# Altium footprint library Altium_Lib.PcbLib: 334 footprints (part 5 of 21)
Each footprint in its own frame and in the unit in brackets; x right, y up, seen from the top. Pads: shape width x height; smd on the part's side, far side on the other; paste and mask are expansions set on the pad; w line width, h text height; cw(c..) or ccw(c..) is an arc to the next point about the centre after c.
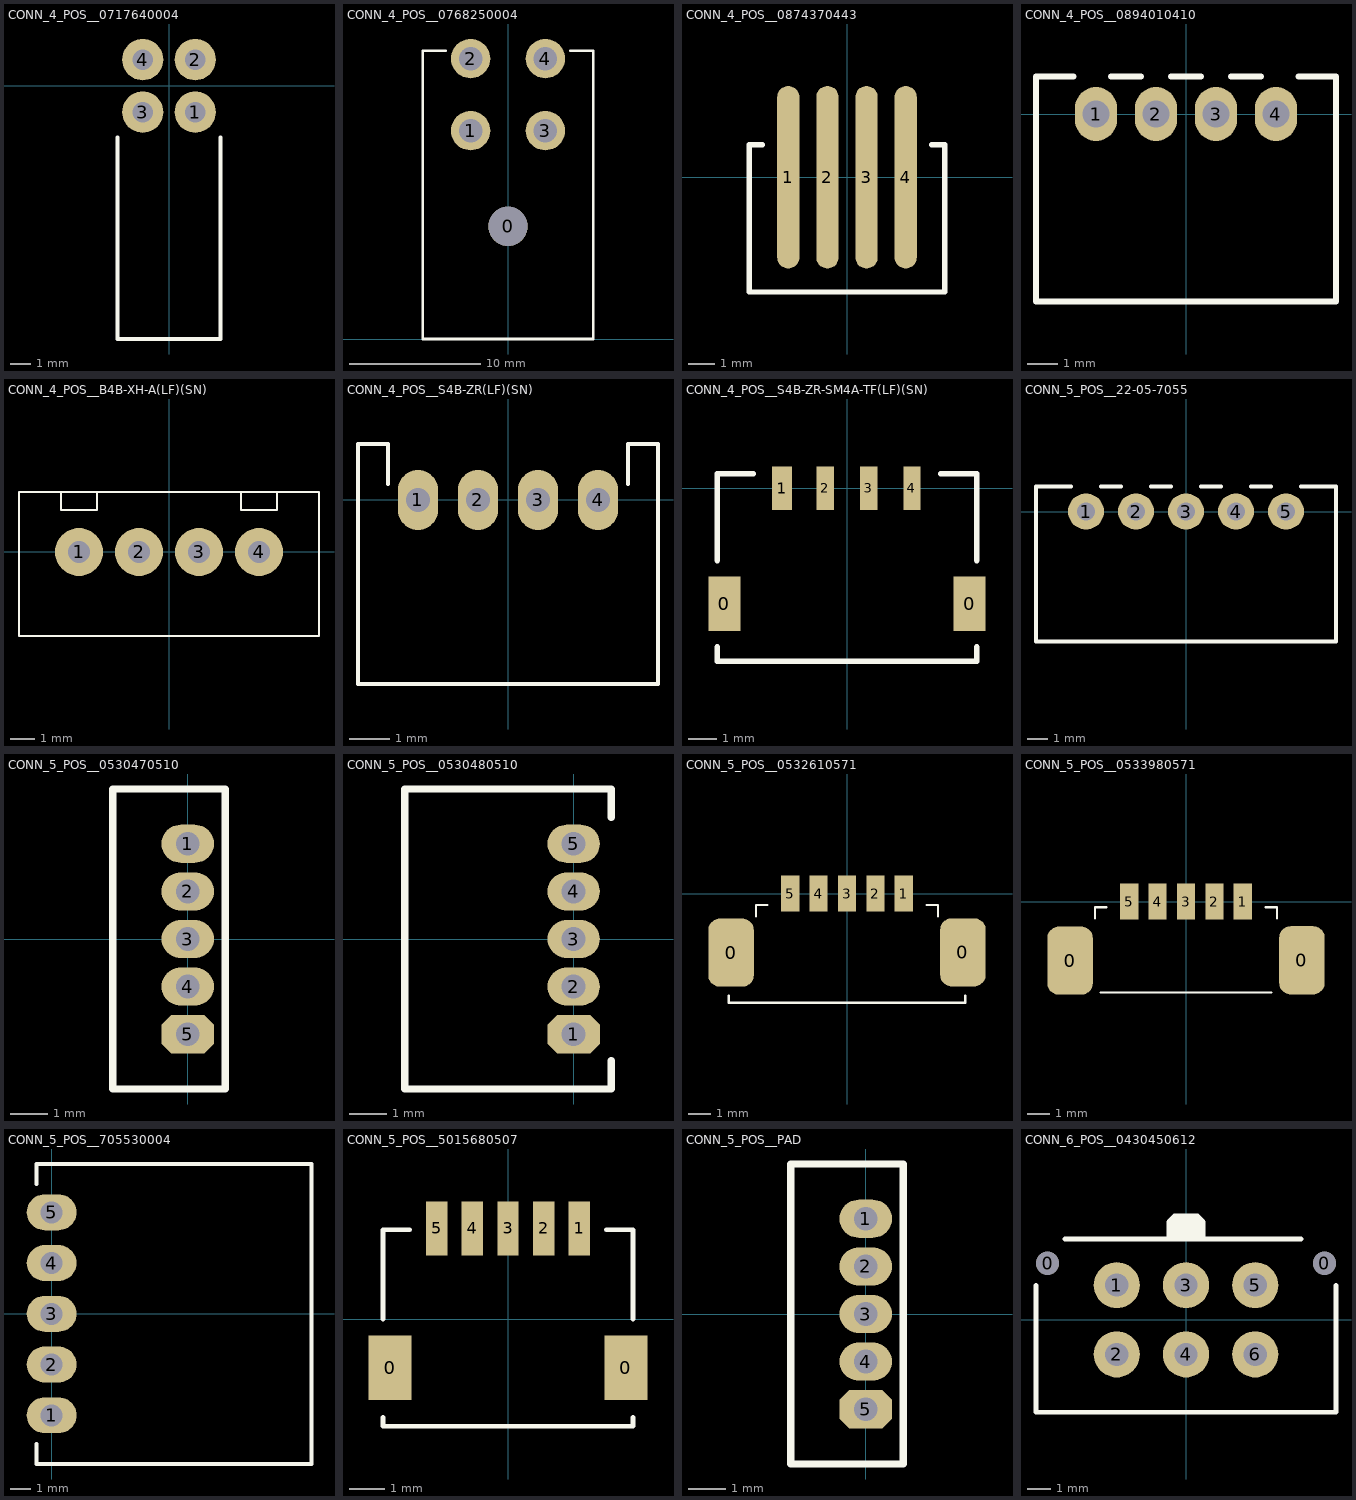
[diagram p4: the footprints below, top view; thin cyan lines are the x and y axes]

## CONN_4_POS__0717640004 [mm]
height 7.37
pads (4):
  round 2 hole 1: 1(1.27,-1.27) 2(1.27,1.27) 3(-1.27,-1.27) 4(-1.27,1.27)
Top Overlay:
  lines w0.2: -2.5,-2.5 -2.5,-12.25 2.5,-12.25 2.5,-2.5
3D body "717640004.stp": height 5.28, standoff -2.59, extent -2.54,-12.294 2.54,1.549

## CONN_4_POS__0768250004 [mm]
pads (5):
  round 3 hole 3 unplated mask+0.05: 0(0,8.6)
  round 3 hole 1.8 mask+0.05: 1(-2.85,15.9) 2(-2.85,21.4) 3(2.85,15.9) 4(2.85,21.4)
Top Overlay:
  lines w0.2: -4.75,22 -6.5,22 -6.5,0 6.5,0 6.5,22 4.75,22
3D body "768250004.stp": height 14.62, standoff -3.52, extent -6.06,0.019 6,21.981

## CONN_4_POS__0874370443 [mm]
pads (4):
  oval 0.85x7 smd mask+0.05: 1(-2.25,0) 2(-0.75,0) 3(0.75,0) 4(2.25,0)
Top Overlay:
  lines w0.2: -3.25,1.25 -3.75,1.25 -3.75,-4.4 3.75,-4.4 3.75,1.25 3.25,1.25
3D body "874380443.stp": height 4.52, standoff 0.01, extent -3.65,-4.375 3.65,3.375

## CONN_4_POS__0894010410 [mm]
height 5.05
pads (4):
  oval 1.4x1.8 hole 0.9: 1(-3,0) 2(-1,0) 3(1,0) 4(3,0)
Top Overlay:
  lines w0.2: -3.75,1.25 -5,1.25 -5,-6.25 5,-6.25 5,1.25 3.75,1.25 ; -2.5,1.25 -1.5,1.25 ; -0.5,1.25 0.5,1.25 ; 1.5,1.25 2.5,1.25
3D body "894010410.stp": height 5.12, standoff -2.93, extent -5,-6.225 5,1.375

## CONN_4_POS__B4B-XH-A(LF)(SN) [mm]
pads (4):
  round 2 hole 0.9 mask+0.05: 1(-3.75,0) 2(-1.25,0) 3(1.25,0) 4(3.75,0)
Top Overlay:
  lines w0.1: -4.5,2.5 -4.5,1.75 -3,1.75 -3,2.5 ; 3,2.5 3,1.75 4.5,1.75 4.5,2.5 ; -6.25,-3.5 -6.25,2.5 6.25,2.5 6.25,-3.5 -6.25,-3.5
3D body "SW3dPS-jst-b4b-xh-a-1.STEP": height 7, standoff -3.4, extent -6.2,-3.375 6.2,2.375

## CONN_4_POS__S4B-ZR(LF)(SN) [mm]
pads (4):
  oval 1x1.5 hole 0.6 mask+0.05: 1(-2.25,0) 2(-0.75,0) 3(0.75,0) 4(2.25,0)
Top Overlay:
  lines w0.1: -3,0.4 -3,1.4 -3.75,1.4 -3.75,-4.6 3.75,-4.6 3.75,1.4 3,1.4 3,0.4
3D body "S4B-ZR.STEP": height 3.8, standoff -2.6, extent -3.75,-4.6 3.75,1.4

## CONN_4_POS__S4B-ZR-SM4A-TF(LF)(SN) [mm]
pads (6):
  rect 1.1x1.9 smd: 0(-4.25,-4) 0(4.25,-4)
  rect 0.7x1.5 smd: 1(-2.25,0)
  rect 0.6x1.5 smd: 2(-0.75,0) 3(0.75,0) 4(2.25,0)
Top Overlay:
  lines w0.2: -4.5,-5.5 -4.5,-6 4.5,-6 4.5,-5.5 ; -4.5,-2.5 -4.5,0.5 -3.25,0.5 ; 3.25,0.5 4.5,0.5 4.5,-2.5
3D body "S4B-ZR-SM4A-TF.STEP": height 3.7, standoff 0, extent -4.5,-6 4.5,0.5

## CONN_5_POS__22-05-7055 [mm] "2.50mm Wafer connector (molex)"
height 4.9
pads (5):
  round 1.8 hole 0.9: 1(-5,0) 2(-2.5,0) 3(0,0) 4(2.5,0) 5(5,0)
Top Overlay:
  lines w0.2: -5.75,1.25 -7.5,1.25 -7.5,-6.5 7.5,-6.5 7.5,1.25 5.75,1.25 ; -4.25,1.25 -3.25,1.25 ; -1.75,1.25 -0.75,1.25 ; 0.75,1.25 1.75,1.25 ; 3.25,1.25 4.25,1.25
3D body "022057055.stp": height 5.05, standoff -3.35, extent -7.45,-6.7 7.45,1.2
3D body: height 4.9, standoff 0, extent -6.002,-1.002 6.002,1.002
3D body: height 4.9, standoff 0, extent -7.6,-6.6 7.6,1.35
3D body: height 4.9, standoff 0, extent -7.501,-6.501 7.501,1.251
3D body: height 4.9, standoff 0, extent -7.6,-6.6 7.6,1.35

## CONN_5_POS__0530470510 [mil]
pads (5):
  oval 55x40 hole 25: 1(0,100) 2(0,50) 3(0,0) 4(0,-50)
  oct 55x40 hole 25: 5(0,-100)
Top Overlay:
  lines w7.87: -78.74,-157.48 39.37,-157.48 39.37,157.48 -78.74,157.48 -78.74,-157.48
3D body "530470510.stp": height 168.31, standoff -87.6, extent -81.69,-157.48 44.3,157.48

## CONN_5_POS__0530480510 [mil]
pads (5):
  oct 55x40 hole 25: 1(0,-100)
  oval 55x40 hole 25: 2(0,-50) 3(0,0) 4(0,50) 5(0,100)
Top Overlay:
  lines w7.87: 39.37,-127.95 39.37,-157.48 -177.17,-157.48 -177.17,157.48 39.37,157.48 39.37,127.95
3D body "530480510.stp": height 141.73, standoff -86.61, extent -176.19,-157.48 40.35,157.49

## CONN_5_POS__0532610571 [mm]
pads (7):
  rrect50% 2x3 smd: 0(-5.1,-2.6) 0(5.1,-2.588)
  rect 0.8x1.6 smd: 1(2.5,0) 2(1.25,0) 3(0,0) 4(-1.25,0) 5(-2.5,0)
Top Overlay:
  lines w0.1: -5.2,-4.5 -5.2,-4.8 -5.147,-4.8 5.1,-4.8 5.2,-4.8 5.2,-4.5 ; -4,-1 -4,-0.5 -3.5,-0.5 ; 3.5,-0.5 4,-0.5 4,-1
3D body "532610571.stp": height 3.45, standoff 0.05, extent -5.7,-4.725 5.7,0.475

## CONN_5_POS__0533980571 [mm]
pads (7):
  rrect50% 2x3 smd: 0(-5.1,-2.6) 0(5.1,-2.588)
  rect 0.8x1.6 smd: 1(2.5,0) 2(1.25,0) 3(0,0) 4(-1.25,0) 5(-2.5,0)
Top Overlay:
  lines w0.1: -4,-0.75 -4,-0.25 -3.5,-0.25 ; -3.75,-4 3.75,-4 ; 3.5,-0.25 4,-0.25 4,-0.75
3D body "533980571.stp": height 4.77, standoff 0.03, extent -5.7,-3.85 5.7,0.35

## CONN_5_POS__705530004 [mm]
pads (5):
  oval 2.5x1.8 hole 1.1 mask+0.076: 1(0,-5.08) 2(0,-2.54) 3(0,0) 4(0,2.54) 5(0,5.08)
Top Overlay:
  lines w0.2: -0.75,-6.52 -0.75,-7.52 13,-7.52 13,4.48 13,7.5 -0.75,7.5 -0.75,6.5
3D body "705530004.stp": height 7.06, standoff -3.22, extent -0.624,-7.62 12.965,7.62

## CONN_5_POS__5015680507 [mm]
pads (7):
  rect 1.2x1.8 smd: 0(-3.3,-1.36) 0(3.3,-1.36)
  rect 0.6x1.5 smd: 1(2,2.54) 2(1,2.54) 3(0,2.54) 4(-1,2.54) 5(-2,2.54)
Top Overlay:
  lines w0.127: -3.5,-2.75 -3.5,-3 3.25,-3 3.5,-3 3.5,-2.75 ; -3.5,0 -3.5,2.5 -2.75,2.5 ; 2.75,2.5 3.5,2.5 3.5,0
3D body "5015680507.stp": height 3.25, standoff 0.05, extent -3.5,-2.925 3.5,2.975

## CONN_5_POS__PAD [mil]
pads (5):
  oval 55x40 hole 25: 1(0,100) 2(0,50) 3(0,0) 4(0,-50)
  oct 55x40 hole 25: 5(0,-100)
Top Overlay:
  lines w7.87: -78.74,-157.48 -78.74,157.48 39.37,157.48 39.37,-157.48 -78.74,-157.48

## CONN_6_POS__0430450612 [mm]
pads (8):
  round 1 hole 1: 0(-6,2.45) 0(6,2.45)
  round 2 hole 1: 1(-3,1.5) 2(-3,-1.5) 3(0,1.5) 4(0,-1.5) 5(3,1.5) 6(3,-1.5)
Top Overlay:
  region: 0.75,3.5 0.75,4.25 0.5,4.5 -0.5,4.5 -0.75,4.25 -0.75,3.5
  lines w0.2: -6.5,1.5 -6.5,-4 6.5,-4 6.5,1.5 ; -5.25,3.5 5,3.5 ; -0.75,3.5 -0.75,4.25 -0.5,4.5 0.5,4.5 0.75,4.25 0.75,3.75 0.75,3.5
3D body "430450612.stp": height 9.95, standoff -3.14, extent -6.55,-3.985 6.6,4.785